# Altium footprint library Lib_001.PcbLib: 429 footprints (part 20 of 28)
Each footprint in its own frame and in the unit in brackets; x right, y up, seen from the top. Pads: shape width x height; smd on the part's side, far side on the other; paste and mask are expansions set on the pad; w line width, h text height; cw(c..) or ccw(c..) is an arc to the next point about the centre after c.
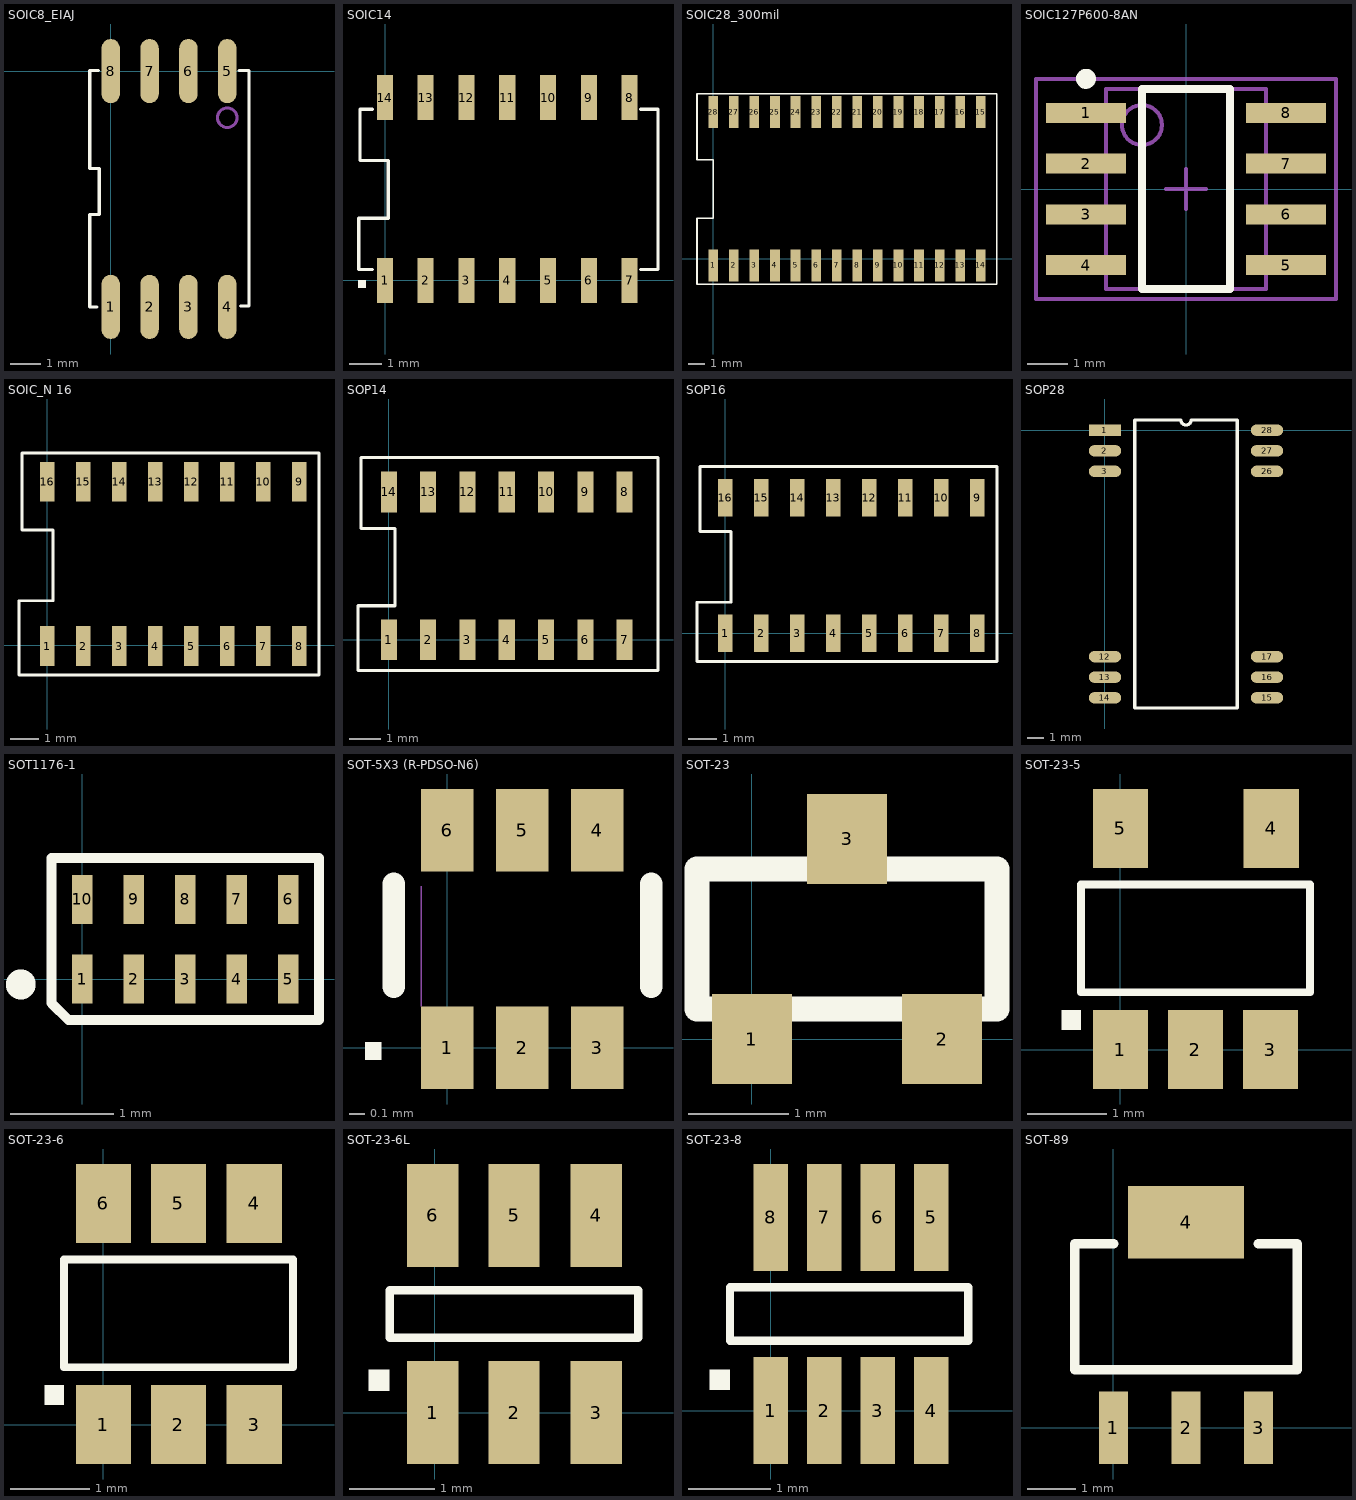
[diagram p19: the footprints below, top view; thin cyan lines are the x and y axes]

## SOIC8_EIAJ [mm]
pads (8):
  oval 0.6x2.1 smd: 1(0,-7.7) 2(1.27,-7.7) 3(2.54,-7.7) 4(3.81,-7.7) 5(3.81,0.009) 6(2.54,0.009) 7(1.27,0.009) 8(0,0.009)
Top Overlay:
  lines w0.1: -0.686,-7.7 -0.686,-4.675 -0.375,-4.675 -0.375,-3.175 -0.686,-3.175 -0.686,0.034 -0.4,0.034 ; -0.675,-7.7 -0.45,-7.7 ; 4.196,0.034 4.521,0.034 4.521,-5.425 4.525,-7.675 4.25,-7.675
Mechanical 3:
  lines w0.102: 3.492,-1.515 cw(c3.81,-1.515) 3.81,-1.198 cw(c3.81,-1.515) 4.127,-1.515 cw(c3.81,-1.515) 3.81,-1.833 cw(c3.81,-1.515) 3.492,-1.515
3D body "User Library-SOIC-8-2.STEP": height 2.58, standoff 0, extent -0.7,-7.875 4.55,0.125

## SOIC14 [mm]
pads (14):
  rect 0.5x1.4 smd: 1(0,0) 2(1.269,0) 3(2.539,0) 4(3.809,0) 5(5.079,0) 6(6.349,0) 7(7.621,0) 8(7.619,5.69) 9(6.349,5.69) 10(5.079,5.69) 11(3.809,5.69) 12(2.539,5.69) 13(1.269,5.69) 14(-0.001,5.69)
Top Overlay:
  rectangle: -0.841,-0.236 -0.591,0.014
  lines w0.102: -0.401,0.336 -0.819,0.336 -0.819,1.935 0.099,1.935 0.099,3.733 -0.779,3.733 -0.779,5.332 -0.401,5.332 ; 7.968,0.336 8.506,0.336 8.506,5.332 7.968,5.332
3D body "SOP14.STEP": height 1.75, standoff 0, extent -1.001,-0.214 8.619,5.986

## SOIC28_300mil [mm]
pads (28):
  rect 0.6x2 smd: 1(0,-0.42) 2(1.27,-0.42) 3(2.54,-0.42) 4(3.81,-0.42) 5(5.08,-0.42) 6(6.35,-0.42) 7(7.62,-0.42) 8(8.89,-0.42) 9(10.16,-0.42) 10(11.43,-0.42) 11(12.7,-0.42) 12(13.97,-0.42) 13(15.24,-0.42) 14(16.51,-0.42) 15(16.51,9.05) 16(15.24,9.05) 17(13.97,9.05) 18(12.7,9.05) 19(11.43,9.05) 20(10.16,9.05) 21(8.89,9.05) 22(7.62,9.05) 23(6.35,9.05) 24(5.08,9.05) 25(3.81,9.05) 26(2.54,9.05) 27(1.27,9.05) 28(0,9.05)
Top Overlay:
  lines w0.102: -0.999,-1.57 -0.999,2.5 0,2.5 0,6.1 -1,6.1 -1,10.17 17.5,10.17 17.5,-1.57 -0.999,-1.57
3D body "User Library-SOIC28-300.step": height 2.65, standoff 0, extent -0.67,-0.83 17.23,9.47

## SOIC127P600-8AN [mm] "SOIC, 8-Leads, Body 4.9x3.9mm, Pitch 1.27mm, IPC Medium Density"
height 2.72
pads (8):
  rect 2x0.5 smd: 1(-2.5,1.905) 2(-2.5,0.635) 3(-2.5,-0.635) 4(-2.5,-1.905) 5(2.5,-1.905) 6(2.5,-0.635) 7(2.5,0.635) 8(2.5,1.905)
Top Overlay:
  circle w0.25: c-2.5,2.755 r0.125
  lines w0.2: -1.1,-2.5 1.1,-2.5 1.1,2.5 -1.1,2.5 -1.1,-2.5
Mechanical 13:
  circle w0.1: c-1.1,1.6 r0.5
  lines w0.1: -2,-2.5 2,-2.5 2,2.5 -2,2.5 -2,-2.5
Mechanical 15:
  lines w0.1: -0.5,0 0.5,0 ; 0,-0.5 0,0.5 ; -3.75,-2.75 3.75,-2.75 3.75,2.75 -3.75,2.75 -3.75,-2.75
3D body "User Library-SOIC-8-1.step": height 1.75, standoff 0, extent -2.94,-2.45 3.06,2.45

## SOIC_N 16 [mm]
pads (16):
  rect 0.52x1.4 smd: 1(0,-0.02) 2(1.27,-0.02) 3(2.54,-0.02) 4(3.81,-0.02) 5(5.08,-0.02) 6(6.35,-0.02) 7(7.62,-0.02) 8(8.89,-0.02) 9(8.89,5.78) 10(7.62,5.78) 11(6.35,5.78) 12(5.08,5.78) 13(3.81,5.78) 14(2.54,5.78) 15(1.27,5.78) 16(0,5.78)
Top Overlay:
  lines w0.102: -0.999,-1.05 9.591,-1.05 9.591,6.8 -0.899,6.8 -0.899,4.077 0.2,4.077 0.2,1.579 -0.999,1.579 -0.999,-1.05
3D body "SOP16.STEP": height 1.75, standoff 0, extent -1.015,-0.152 9.875,6.048

## SOP14 [mil]
pads (14):
  rect 20.47x52 smd: 1(0,0) 2(50,0) 3(100,0) 4(150,0) 5(200,0) 6(250,0) 7(300,0) 8(300,188.18) 9(250,188.18) 10(200,188.18) 11(150,188.18) 12(100,188.18) 13(50,188.18) 14(0,188.18)
Top Overlay:
  lines w4: -39.33,-39.33 342.52,-39.33 342.52,24.58 342.52,160.28 342.52,232.07 -35.4,232.07 -35.4,141.6 7.87,141.6 7.87,43.27 -39.33,43.27 -39.33,-39.33
3D body "29105.stp": height 68.9, standoff 5.51, extent -21.65,-27.55 320.87,216.54

## SOP16 [mil]
pads (16):
  rect 20.47x52 smd: 1(0,0) 2(50,0) 3(100,0) 4(150,0) 5(200,0) 6(250,0) 7(300,0) 8(350,0) 9(350,188.18) 10(300,188.18) 11(250,188.18) 12(200,188.18) 13(150,188.18) 14(100,188.18) 15(50,188.18) 16(0,188.18)
Top Overlay:
  lines w4: -39.33,-39.33 -39.33,43.27 7.87,43.27 7.87,141.6 -35.4,141.6 -35.4,232.07 377.6,232.07 377.6,-39.33 -39.33,-39.33
3D body "SOP16.STEP": height 68.9, standoff 0, extent -39.17,-27.56 389.57,216.53

## SOP28 [mm]
pads (12):
  rect 2x0.7 smd: 1(0,0)
  oval 2x0.7 smd: 2(0,-1.27) 3(0,-2.54) 12(0,-13.97) 13(0,-15.24) 14(0,-16.51) 15(10,-16.51) 16(10,-15.24) 17(10,-13.97) 26(10,-2.54) 27(10,-1.27) 28(10,0)
Top Overlay:
  lines w0.2: 1.835,-17.145 8.165,-17.145 8.165,0.635 5.318,0.635 cw(c5,0.635) 4.683,0.635 1.835,0.635 1.835,-17.145
3D body: height 2.7, standoff 0, extent 1.835,-17.145 8.165,0.635

## SOT1176-1 [mm]
pads (10):
  rect 0.2x0.475 smd mask+0.05: 1(0,0) 2(0.5,0) 3(1,0) 4(1.5,0) 5(2,0) 6(2,0.773) 7(1.5,0.773) 8(1,0.773) 9(0.5,0.773) 10(0,0.773)
Top Overlay:
  circle w0.254: c-0.597,-0.052 r0.017
  lines w0.1: -0.299,-0.233 -0.135,-0.397 2.297,-0.397 2.297,1.175 -0.299,1.175 -0.299,-0.233
3D body "User Library-SOT1176-1-1.step": height 0.54, standoff -0.01, extent -0.252,-0.127 2.248,0.875

## SOT-5X3 (R-PDSO-N6) [mm]
pads (6):
  rect 0.35x0.55 smd: 1(0,0) 2(0.5,0) 3(1,0) 4(1,1.45) 5(0.5,1.45) 6(0,1.45)
Top Overlay:
  rectangle: -0.551,-0.081 -0.44,0.038
  lines w0.15: -0.358,0.407 -0.358,1.095 ; 1.358,0.407 1.358,1.095
Mechanical 1:
  lines w0.01: -0.175,0.275 -0.175,1.075
3D body "User Library-R-PDSO-N6.step": height 0.6, standoff 0, extent -0.347,-0.124 1.353,1.576

## SOT-23 [mm]
height 1.11
pads (3):
  rect 0.8x0.9 smd: 1(0,0) 2(1.9,0) 3(0.95,2)
Top Overlay:
  lines w0.254: -0.55,0.3 -0.55,1.7 2.45,1.7 2.45,0.3 -0.55,0.3
3D body "User Library-SOT-23-3-1.STEP": height 1.1, standoff 0, extent -0.55,-0.282 2.45,2.26

## SOT-23-5 [mm] "SOT-23 5pin"
height 1
pads (5):
  rect 0.7x1 smd: 1(0,0) 2(0.95,0) 3(1.9,0) 4(1.91,2.8) 5(0,2.8)
Top Overlay:
  rectangle: -0.75,0.25 -0.5,0.5
  lines w0.1: -0.5,0.725 2.4,0.725 2.4,2.09 -0.5,2.09 -0.5,0.725
3D body "sot235.step": height 1, standoff 0, extent -0.48,0.22 2.44,2.56

## SOT-23-6 [mm] "SOT-23 5pin"
height 1
pads (6):
  rect 0.7x1 smd: 1(0,0) 2(0.95,0) 3(1.91,0) 4(1.91,2.8) 5(0.95,2.8) 6(0,2.8)
Top Overlay:
  rectangle: -0.75,0.25 -0.5,0.5
  lines w0.1: -0.5,0.725 2.4,0.725 2.4,2.09 -0.5,2.09 -0.5,0.725
3D body "User Library-SOT23-6-4.STEP": height 1.05, standoff -0.05, extent -0.508,0.191 2.392,2.591

## SOT-23-6L [mm]
pads (6):
  rect 0.6x1.2 smd: 1(-0.025,0) 2(0.925,0) 3(1.885,0) 4(1.885,2.3) 5(0.925,2.3) 6(-0.025,2.3)
Top Overlay:
  rectangle: -0.775,0.25 -0.525,0.5
  lines w0.1: -0.525,0.875 2.375,0.875 2.375,1.425 -0.525,1.425 -0.525,0.875
3D body "User Library-SOT-23-6L.STEP": height 1.3, standoff -0.1, extent -0.598,-0.35 2.45,2.65

## SOT-23-8 [mm] "SOT-23 5pin"
height 1
pads (8):
  rect 0.42x1.3 smd: 1(0,0) 2(0.65,0) 3(1.3,0) 4(1.95,0) 5(1.95,2.35) 6(1.3,2.35) 7(0.65,2.35) 8(0,2.35)
Top Overlay:
  rectangle: -0.75,0.25 -0.5,0.5
  lines w0.1: -0.5,0.849 2.4,0.849 2.4,1.5 -0.5,1.5 -0.5,0.849
3D body "User Library-SOT23-8.step": height 1.11, standoff 0, extent -0.532,-0.233 2.468,2.571

## SOT-89 [mm]
pads (4):
  rect 0.6x1.5 smd: 1(0,0) 2(1.5,0) 3(3,0)
  rect 2.4x1.5 smd: 4(1.5,4.25)
Top Overlay:
  lines w0.2: 0,3.8 -0.8,3.8 -0.8,1.2 3.8,1.2 3.8,3.8 3,3.8
3D body "User Library-SOT-89-3.STEP": height 1.5, standoff 0, extent -0.786,0.211 3.714,4.211